# Altium footprint library SMD_Bauteile.PcbLib: 355 footprints (part 6 of 23)
Each footprint in its own frame and in the unit in brackets; x right, y up, seen from the top. Pads: shape width x height; smd on the part's side, far side on the other; paste and mask are expansions set on the pad; w line width, h text height; cw(c..) or ccw(c..) is an arc to the next point about the centre after c.
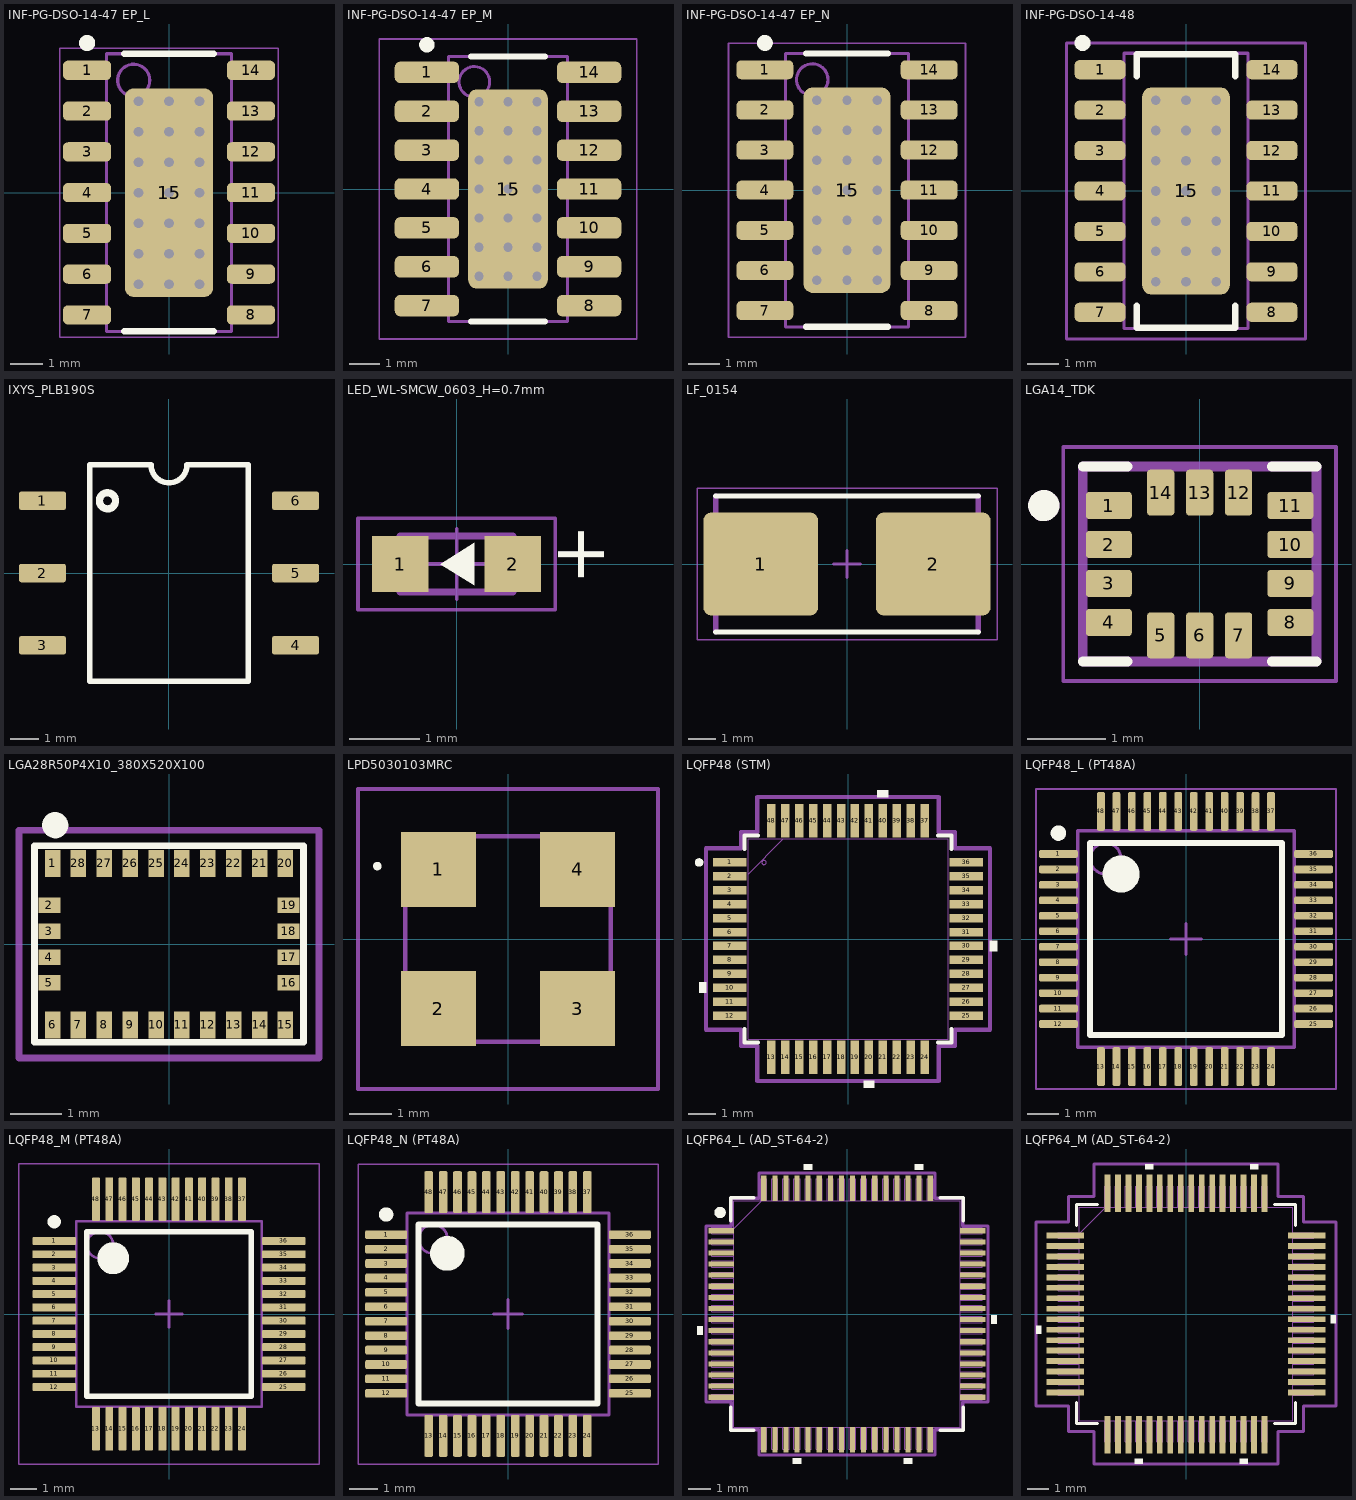
[diagram p5: the footprints below, top view; thin cyan lines are the x and y axes]

## INF-PG-DSO-14-47 EP_L [mm] "SOP, 14-Leads, Body 8.65x3.9mm, Pitch 1.27mm, Thermal Pad 6.5x2.75mm, IPC High Density"
height 1.7
pads (15):
  rrect50% 1.5x0.6 smd: 1(-2.55,3.81) 2(-2.55,2.54) 3(-2.55,1.27) 4(-2.55,0) 5(-2.55,-1.27) 6(-2.55,-2.54) 7(-2.55,-3.81) 8(2.55,-3.81) 9(2.55,-2.54) 10(2.55,-1.27) 11(2.55,0) 12(2.55,1.27) 13(2.55,2.54) 14(2.55,3.81)
  rrect20% 2.75x6.5 smd: 15(0,0)
via 0.95,0 diameter 0.7 hole 0.3
via 0.95,-0.95 diameter 0.7 hole 0.3
via -0.95,-0.95 diameter 0.7 hole 0.3
via 0,0 diameter 0.7 hole 0.3
via 0,-0.95 diameter 0.7 hole 0.3
via 0.95,1.9 diameter 0.7 hole 0.3
via 0.95,2.85 diameter 0.7 hole 0.3
via 0.95,-1.9 diameter 0.7 hole 0.3
via 0.95,-2.85 diameter 0.7 hole 0.3
via 0,-2.85 diameter 0.7 hole 0.3
via 0,-1.9 diameter 0.7 hole 0.3
via 0,0.95 diameter 0.7 hole 0.3
via 0,1.9 diameter 0.7 hole 0.3
via -0.95,1.9 diameter 0.7 hole 0.3
via -0.95,0.95 diameter 0.7 hole 0.3
via -0.95,0 diameter 0.7 hole 0.3
via -0.95,-1.9 diameter 0.7 hole 0.3
via -0.95,-2.85 diameter 0.7 hole 0.3
via 0.95,0.95 diameter 0.7 hole 0.3
via 0,2.85 diameter 0.7 hole 0.3
via -0.95,2.85 diameter 0.7 hole 0.3
Top Overlay:
  circle w0.25: c-2.55,4.66 r0.125
  lines w0.2: -1.4,-4.325 1.4,-4.325 ; -1.4,4.325 1.4,4.325
Top Component Center:
  lines w0.1: -0.5,0 0.5,0 ; 0,-0.5 0,0.5
Top Component Outline:
  circle w0.1: c-1.1,3.5 r0.5
  lines w0.1: -1.95,-4.325 1.95,-4.325 1.95,4.325 -1.95,4.325 -1.95,-4.325
Top Courtyard (Mech26):
  lines w0.05: -3.4,-4.5 3.4,-4.5 3.4,4.5 -3.4,4.5 -3.4,-4.5
3D body: height 1.7, standoff 0, extent -1.95,-4.325 1.95,4.325

## INF-PG-DSO-14-47 EP_M [mm] "SOP, 14-Leads, Body 8.65x3.9mm, Pitch 1.27mm, Thermal Pad 6.5x2.75mm, IPC Low Density"
height 1.7
pads (15):
  rrect50% 2.1x0.7 smd: 1(-2.65,3.81) 2(-2.65,2.54) 3(-2.65,1.27) 4(-2.65,0) 5(-2.65,-1.27) 6(-2.65,-2.54) 7(-2.65,-3.81) 8(2.65,-3.81) 9(2.65,-2.54) 10(2.65,-1.27) 11(2.65,0) 12(2.65,1.27) 13(2.65,2.54) 14(2.65,3.81)
  rrect20% 2.6x6.5 smd: 15(0,0)
via 0.95,0 diameter 0.7 hole 0.3
via 0.95,-0.95 diameter 0.7 hole 0.3
via -0.95,-0.95 diameter 0.7 hole 0.3
via 0,0 diameter 0.7 hole 0.3
via 0,-0.95 diameter 0.7 hole 0.3
via 0.95,1.9 diameter 0.7 hole 0.3
via 0.95,2.85 diameter 0.7 hole 0.3
via 0.95,-1.9 diameter 0.7 hole 0.3
via 0.95,-2.85 diameter 0.7 hole 0.3
via 0,-2.85 diameter 0.7 hole 0.3
via 0,-1.9 diameter 0.7 hole 0.3
via 0,0.95 diameter 0.7 hole 0.3
via 0,1.9 diameter 0.7 hole 0.3
via -0.95,1.9 diameter 0.7 hole 0.3
via -0.95,0.95 diameter 0.7 hole 0.3
via -0.95,0 diameter 0.7 hole 0.3
via -0.95,-1.9 diameter 0.7 hole 0.3
via -0.95,-2.85 diameter 0.7 hole 0.3
via 0.95,0.95 diameter 0.7 hole 0.3
via 0,2.85 diameter 0.7 hole 0.3
via -0.95,2.85 diameter 0.7 hole 0.3
Top Overlay:
  circle w0.25: c-2.65,4.71 r0.125
  lines w0.2: -1.2,-4.325 1.2,-4.325 ; -1.2,4.325 1.2,4.325
Top Component Center:
  lines w0.1: -0.5,0 0.5,0 ; 0,-0.5 0,0.5
Top Component Outline:
  circle w0.1: c-1.1,3.5 r0.5
  lines w0.1: -1.95,-4.325 -1.95,4.325 1.95,4.325 1.95,-4.325 -1.95,-4.325
Top Courtyard (Mech26):
  lines w0.05: -4.2,-4.9 -4.2,4.9 4.2,4.9 4.2,-4.9 -4.2,-4.9
3D body: height 1.7, standoff 0, extent -1.95,-4.325 1.95,4.325

## INF-PG-DSO-14-47 EP_N [mm] "SOP, 14-Leads, Body 8.65x3.9mm, Pitch 1.27mm, Thermal Pad 6.5x2.75mm, IPC Medium Density"
height 1.7
pads (15):
  rrect50% 1.8x0.6 smd: 1(-2.6,3.81) 2(-2.6,2.54) 3(-2.6,1.27) 4(-2.6,0) 5(-2.6,-1.27) 6(-2.6,-2.54) 7(-2.6,-3.81) 8(2.6,-3.81) 9(2.6,-2.54) 10(2.6,-1.27) 11(2.6,0) 12(2.6,1.27) 13(2.6,2.54) 14(2.6,3.81)
  rrect20% 2.75x6.5 smd: 15(0,0)
via -0.95,2.85 diameter 0.7 hole 0.3
via 0,2.85 diameter 0.7 hole 0.3
via 0.95,0.95 diameter 0.7 hole 0.3
via -0.95,-2.85 diameter 0.7 hole 0.3
via -0.95,-1.9 diameter 0.7 hole 0.3
via -0.95,0 diameter 0.7 hole 0.3
via -0.95,0.95 diameter 0.7 hole 0.3
via -0.95,1.9 diameter 0.7 hole 0.3
via 0,1.9 diameter 0.7 hole 0.3
via 0,0.95 diameter 0.7 hole 0.3
via 0,-1.9 diameter 0.7 hole 0.3
via 0,-2.85 diameter 0.7 hole 0.3
via 0.95,-2.85 diameter 0.7 hole 0.3
via 0.95,-1.9 diameter 0.7 hole 0.3
via 0.95,2.85 diameter 0.7 hole 0.3
via 0.95,1.9 diameter 0.7 hole 0.3
via 0,-0.95 diameter 0.7 hole 0.3
via 0,0 diameter 0.7 hole 0.3
via -0.95,-0.95 diameter 0.7 hole 0.3
via 0.95,-0.95 diameter 0.7 hole 0.3
via 0.95,0 diameter 0.7 hole 0.3
Top Overlay:
  circle w0.25: c-2.6,4.66 r0.125
  lines w0.2: -1.3,-4.325 1.3,-4.325 ; -1.3,4.325 1.3,4.325
Top Component Center:
  lines w0.1: -0.5,0 0.5,0 ; 0,-0.5 0,0.5
Top Component Outline:
  circle w0.1: c-1.1,3.5 r0.5
  lines w0.1: -1.95,-4.325 1.95,-4.325 1.95,4.325 -1.95,4.325 -1.95,-4.325
Top Courtyard (Mech26):
  lines w0.05: -3.75,-4.65 3.75,-4.65 3.75,4.65 -3.75,4.65 -3.75,-4.65
3D body: height 1.7, standoff 0, extent -1.95,-4.325 1.95,4.325

## INF-PG-DSO-14-48 [mm] "SOIC,1.27mm pitch;14 pin,3.90mm W X 8.65mm L X 1.70mm H body (w/thermal tab)"
height 1.7
pads (15):
  rrect50% 1.6x0.6 smd paste+0 mask+0: 1(-2.7,3.81) 2(-2.7,2.54) 3(-2.7,1.27) 4(-2.7,0) 5(-2.7,-1.27) 6(-2.7,-2.54) 7(-2.7,-3.81) 8(2.7,-3.81) 9(2.7,-2.54) 10(2.7,-1.27) 11(2.7,0) 12(2.7,1.27) 13(2.7,2.54) 14(2.7,3.81)
  rrect20% 2.75x6.5 smd paste+0 mask+0: 15(0,0)
via -0.95,2.85 diameter 0.7 hole 0.3
via 0,2.85 diameter 0.7 hole 0.3
via 0.95,0.95 diameter 0.7 hole 0.3
via -0.95,-2.85 diameter 0.7 hole 0.3
via -0.95,-1.9 diameter 0.7 hole 0.3
via -0.95,0 diameter 0.7 hole 0.3
via -0.95,0.95 diameter 0.7 hole 0.3
via -0.95,1.9 diameter 0.7 hole 0.3
via 0,1.9 diameter 0.7 hole 0.3
via 0,0.95 diameter 0.7 hole 0.3
via 0,-1.9 diameter 0.7 hole 0.3
via 0,-2.85 diameter 0.7 hole 0.3
via 0.95,-2.85 diameter 0.7 hole 0.3
via 0.95,-1.9 diameter 0.7 hole 0.3
via 0.95,2.85 diameter 0.7 hole 0.3
via 0.95,1.9 diameter 0.7 hole 0.3
via 0,-0.95 diameter 0.7 hole 0.3
via 0,0 diameter 0.7 hole 0.3
via -0.95,-0.95 diameter 0.7 hole 0.3
via 0.95,-0.95 diameter 0.7 hole 0.3
via 0.95,0 diameter 0.7 hole 0.3
Top Overlay:
  circle w0.25: c-3.25,4.65 r0.125
  lines w0.2: -1.55,-3.6 -1.55,-4.3 1.55,-4.3 1.55,-3.6 ; -1.55,3.6 -1.55,4.3 1.55,4.3 1.55,3.6
Top Component Center:
  lines w0.1: -0.5,0 0.5,0 ; 0,-0.5 0,0.5
Top Component Outline:
  lines w0.1: -1.95,-4.325 -1.95,4.325 1.95,4.325 1.95,-4.325 -1.95,-4.325
Top Courtyard (Mech26):
  lines w0.1: -3.75,-4.65 -3.75,4.65 3.75,4.65 3.75,-4.65 -3.75,-4.65
3D body "DSO-14-33.stp": height 1.71, standoff 0, extent -3,-4.325 3,4.325

## IXYS_PLB190S [mm]
pads (6):
  rrect25% 1.65x0.65 smd: 1(-4.445,2.54) 2(-4.445,0) 3(-4.445,-2.54) 4(4.455,-2.54) 5(4.455,0) 6(4.455,2.54)
Top Overlay:
  circle w0.254: c-2.159,2.54 r0.284
  lines w0.2: -2.785,-3.81 -2.785,3.81 -0.63,3.81 ccw(c0.005,3.81) 0.64,3.81 2.795,3.81 2.795,-3.81 -2.785,-3.81
3D body: height 3.3, standoff 1.14, extent -3.175,-4.191 3.175,4.191

## LED_WL-SMCW_0603_H=0.7mm [mm] "SMD Mono-color Chip LED, body 1.6x0.8mm"
height 0.7
pads (2):
  rect 0.8x0.8 smd: 1(-0.8,0) 2(0.8,0)
Top Overlay:
  region: -0.233,0 0.25,-0.3 0.25,0.3
  text "+" at 2.1,-0.3 h0.76
Bottom Designator:
  lines w0.05: -1.4,-0.65 -1.4,0.65 1.4,0.65 1.4,-0.65 -1.4,-0.65
Bottom 3D Body:
  lines w0.05: -0.5,0 0.5,0 ; 0,-0.5 0,0.5
Top Courtyard (Mech14):
  lines w0.1: -0.8,-0.4 0.8,-0.4 0.8,0.4 -0.8,0.4 -0.8,-0.4
3D body "150060xxx.stp": height 0.7, standoff 0, extent -0.8,-0.4 0.8,0.4

## LF_0154 [mm]
height 3.81
pads (2):
  rrect15% 4.24x3.81 smd: 1(-3.19,0) 2(3.19,0)
Top Overlay:
  lines w0.2: -4.863,-2.515 4.863,-2.515 ; -4.863,2.515 4.863,2.515
Top Component Center:
  lines w0.1: -0.5,0 0.5,0 ; 0,-0.5 0,0.5
Top Component Outline:
  lines w0.2: -4.863,-2.515 -4.863,2.515 -4.863,-2.515 ; 4.863,-2.515 4.863,2.515 4.863,-2.515
Top Courtyard (Mech26):
  lines w0.05: -5.55,-2.8 5.55,-2.8 5.55,2.8 -5.55,2.8 -5.55,-2.8
3D body "LF_0154.STEP": height 3.81, standoff 0, extent -4.865,-2.515 4.865,2.515

## LGA14_TDK [mm]
pads (14):
  rrect25% 0.59x0.35 smd mask+0.02: 1(-1.165,0.75) 2(-1.165,0.25) 3(-1.165,-0.25) 4(-1.165,-0.75) 8(1.165,-0.75) 9(1.165,-0.25) 10(1.165,0.25) 11(1.165,0.75)
  rrect25% 0.35x0.59 smd mask+0.02: 5(-0.5,-0.915) 6(0,-0.915) 7(0.5,-0.915) 12(0.5,0.915) 13(0,0.915) 14(-0.5,0.915)
Top Overlay:
  circle w0.2: c-2,0.75 r0.1
  lines w0.127: -1.5,-1.25 -0.925,-1.25 ; -1.5,1.25 -0.925,1.25 ; 0.925,-1.25 1.5,-1.25 ; 0.925,1.25 1.5,1.25
Mech Misc 1:
  circle w0.2: c-2,0.75 r0.1
  lines w0.127: -1.5,-1.25 -1.5,1.25 1.5,1.25 1.5,-1.25 -1.5,-1.25
Mech 15:
  lines w0.05: -1.75,-1.5 -1.75,1.5 1.75,1.5 1.75,-1.5 -1.75,-1.5
3D body "step_temp.STEP": height 0.97, standoff 0, extent -1.5,-1.25 1.5,1.25

## LGA28R50P4X10_380X520X100 [mm]
pads (28):
  rect 0.3x0.525 smd: 1(-2.25,1.562) 6(-2.25,-1.562) 7(-1.75,-1.562) 8(-1.25,-1.562) 9(-0.75,-1.562) 10(-0.25,-1.562) 11(0.25,-1.562) 12(0.75,-1.562) 13(1.25,-1.562) 14(1.75,-1.562) 15(2.25,-1.562) 20(2.25,1.562) 21(1.75,1.562) 22(1.25,1.562) 23(0.75,1.562) 24(0.25,1.562) 25(-0.25,1.562) 26(-0.75,1.562) 27(-1.25,1.562) 28(-1.75,1.562)
  rect 0.425x0.3 smd: 2(-2.312,0.75) 3(-2.312,0.25) 4(-2.312,-0.25) 5(-2.312,-0.75) 16(2.312,-0.75) 17(2.312,-0.25) 18(2.312,0.25) 19(2.312,0.75)
Top Overlay:
  circle w0.305: c-2.2,2.3 r0.1
  lines w0.127: -2.6,-1.9 -2.6,1.9 2.6,1.9 2.6,-1.9 -2.6,-1.9
Mech 15:
  lines w0.127: -2.9,-2.2 2.9,-2.2 2.9,2.2 -2.9,2.2 -2.9,-2.2

## LPD5030103MRC [mm]
pads (4):
  rect 1.75x1.75 smd: 1(-1.625,1.625) 2(-1.625,-1.625) 3(1.625,-1.625) 4(1.625,1.625)
Top Overlay:
  lines w0.1: -3.1,1.7 cw(c-3.05,1.7) -3,1.7 cw(c-3.05,1.7) -3.1,1.7
Mech 15:
  lines w0.1: -2.4,-1.6 -1.6,-2.4 1.6,-2.4 2.4,-1.6 2.4,1.6 1.6,2.4 -1.6,2.4 -2.4,1.6 -2.4,-1.6
Top 3D Body:
  lines w0.1: -3.5,-3.5 -3.5,3.5 3.5,3.5 3.5,-3.5 -3.5,-3.5
3D body "LPD5030-103MRC.stp": height 5.8, standoff -4.65, extent -10,-3.376 10,3.376

## LQFP48 (STM) [mm]
pads (48):
  rect 1.194x0.305 smd paste+0 mask+0: 1(-4.25,2.75) 2(-4.25,2.25) 3(-4.25,1.75) 4(-4.25,1.25) 5(-4.25,0.75) 6(-4.25,0.25) 7(-4.25,-0.25) 8(-4.25,-0.75) 9(-4.25,-1.25) 10(-4.25,-1.75) 11(-4.25,-2.25) 12(-4.25,-2.75) 25(4.25,-2.75) 26(4.25,-2.25) 27(4.25,-1.75) 28(4.25,-1.25) 29(4.25,-0.75) 30(4.25,-0.25) 31(4.25,0.25) 32(4.25,0.75) 33(4.25,1.25) 34(4.25,1.75) 35(4.25,2.25) 36(4.25,2.75)
  rect 0.305x1.194 smd paste+0 mask+0: 13(-2.75,-4.25) 14(-2.25,-4.25) 15(-1.75,-4.25) 16(-1.25,-4.25) 17(-0.75,-4.25) 18(-0.25,-4.25) 19(0.25,-4.25) 20(0.75,-4.25) 21(1.25,-4.25) 22(1.75,-4.25) 23(2.25,-4.25) 24(2.75,-4.25) 37(2.75,4.25) 38(2.25,4.25) 39(1.75,4.25) 40(1.25,4.25) 41(0.75,4.25) 42(0.25,4.25) 43(-0.25,4.25) 44(-0.75,4.25) 45(-1.25,4.25) 46(-1.75,4.25) 47(-2.25,4.25) 48(-2.75,4.25)
Top Overlay:
  circle w0.152: c-5.351,2.75 r0.076
  region: 1.441,5.101 1.06,5.101 1.06,5.355 1.441,5.355
  region: 5.101,-0.059 5.355,-0.059 5.355,-0.44 5.101,-0.44
  region: 0.941,-5.101 0.56,-5.101 0.56,-5.355 0.941,-5.355
  region: -5.101,-1.559 -5.355,-1.559 -5.355,-1.94 -5.101,-1.94
  lines w0.152: -3.721,-3.235 -3.721,-3.721 -3.235,-3.721 ; -3.721,3.235 -3.721,3.721 -3.235,3.721 ; 3.235,-3.721 3.721,-3.721 3.721,-3.235 ; 3.235,3.721 3.721,3.721 3.721,3.235
Mech Misc 1:
  circle w0: c-3.018,2.75 r0.076
  lines w0.025: -3.594,2.324 -2.324,3.594 ; -3.594,-3.594 -3.594,3.594 3.594,3.594 3.594,-3.594 -3.594,-3.594
Mech 15:
  lines w0.152: -5.101,-3.258 -5.101,3.258 -3.848,3.258 -3.848,3.848 -3.258,3.848 -3.258,5.101 3.258,5.101 3.258,3.848 3.848,3.848 3.848,3.258 5.101,3.258 5.101,-3.258 3.848,-3.258 3.848,-3.848 3.258,-3.848 3.258,-5.101 -3.258,-5.101 -3.258,-3.848 -3.848,-3.848 -3.848,-3.258 -5.101,-3.258
3D body "LQFP48-7x7mm.step": height 1.6, standoff 0, extent -4.497,-4.497 4.497,4.497

## LQFP48_L (PT48A) [mm] "QFP, 48-Leads, Body 7x7mm, Pitch 0.5mm, IPC High Density"
height 1.6
pads (48):
  rrect40% 1.25x0.25 smd: 1(-4.125,2.75) 2(-4.125,2.25) 3(-4.125,1.75) 4(-4.125,1.25) 5(-4.125,0.75) 6(-4.125,0.25) 7(-4.125,-0.25) 8(-4.125,-0.75) 9(-4.125,-1.25) 10(-4.125,-1.75) 11(-4.125,-2.25) 12(-4.125,-2.75) 25(4.125,-2.75) 26(4.125,-2.25) 27(4.125,-1.75) 28(4.125,-1.25) 29(4.125,-0.75) 30(4.125,-0.25) 31(4.125,0.25) 32(4.125,0.75) 33(4.125,1.25) 34(4.125,1.75) 35(4.125,2.25) 36(4.125,2.75)
  rrect40% 0.25x1.25 smd: 13(-2.75,-4.125) 14(-2.25,-4.125) 15(-1.75,-4.125) 16(-1.25,-4.125) 17(-0.75,-4.125) 18(-0.25,-4.125) 19(0.25,-4.125) 20(0.75,-4.125) 21(1.25,-4.125) 22(1.75,-4.125) 23(2.25,-4.125) 24(2.75,-4.125) 37(2.75,4.125) 38(2.25,4.125) 39(1.75,4.125) 40(1.25,4.125) 41(0.75,4.125) 42(0.25,4.125) 43(-0.25,4.125) 44(-0.75,4.125) 45(-1.25,4.125) 46(-1.75,4.125) 47(-2.25,4.125) 48(-2.75,4.125)
Top Overlay:
  circle w0.6: c-2.1,2.1 r0.3
  circle w0.25: c-4.125,3.425 r0.125
  lines w0.2: -3.1,-3.1 3.1,-3.1 3.1,3.1 -3.1,3.1 -3.1,-3.1
Mechanical 1:
  text ".Designator" at -1.524,-0.508 h1.02
Mech Misc 1:
  circle w0.1: c-2.6,2.6 r0.5
  lines w0.1: -3.5,-3.5 3.5,-3.5 3.5,3.5 -3.5,3.5 -3.5,-3.5
Mech 15:
  lines w0.05: -4.85,-4.85 4.85,-4.85 4.85,4.85 -4.85,4.85 -4.85,-4.85
  lines w0.1: -0.5,0 0.5,0 ; 0,-0.5 0,0.5
3D body "PT0048A.stp": height 1.5, standoff 0, extent -4.508,-4.508 4.508,4.508

## LQFP48_M (PT48A) [mm] "QFP, 48-Leads, Body 7x7mm, Pitch 0.5mm, IPC Low Density"
height 1.6
pads (48):
  rrect33% 1.65x0.3 smd: 1(-4.325,2.75) 2(-4.325,2.25) 3(-4.325,1.75) 4(-4.325,1.25) 5(-4.325,0.75) 6(-4.325,0.25) 7(-4.325,-0.25) 8(-4.325,-0.75) 9(-4.325,-1.25) 10(-4.325,-1.75) 11(-4.325,-2.25) 12(-4.325,-2.75) 25(4.325,-2.75) 26(4.325,-2.25) 27(4.325,-1.75) 28(4.325,-1.25) 29(4.325,-0.75) 30(4.325,-0.25) 31(4.325,0.25) 32(4.325,0.75) 33(4.325,1.25) 34(4.325,1.75) 35(4.325,2.25) 36(4.325,2.75)
  rrect33% 0.3x1.65 smd: 13(-2.75,-4.325) 14(-2.25,-4.325) 15(-1.75,-4.325) 16(-1.25,-4.325) 17(-0.75,-4.325) 18(-0.25,-4.325) 19(0.25,-4.325) 20(0.75,-4.325) 21(1.25,-4.325) 22(1.75,-4.325) 23(2.25,-4.325) 24(2.75,-4.325) 37(2.75,4.325) 38(2.25,4.325) 39(1.75,4.325) 40(1.25,4.325) 41(0.75,4.325) 42(0.25,4.325) 43(-0.25,4.325) 44(-0.75,4.325) 45(-1.25,4.325) 46(-1.75,4.325) 47(-2.25,4.325) 48(-2.75,4.325)
Top Overlay:
  circle w0.25: c-4.325,3.475 r0.125
  circle w0.6: c-2.1,2.1 r0.3
  lines w0.2: -3.1,-3.1 -3.1,3.1 3.1,3.1 3.1,-3.1 -3.1,-3.1
Mechanical 1:
  text ".Designator" at -1.524,-0.508 h1.02
Mech Misc 1:
  circle w0.1: c-2.6,2.6 r0.5
  lines w0.1: -3.5,-3.5 -3.5,3.5 3.5,3.5 3.5,-3.5 -3.5,-3.5
Mech 15:
  lines w0.05: -5.65,-5.65 -5.65,5.65 5.65,5.65 5.65,-5.65 -5.65,-5.65
  lines w0.1: -0.5,0 0.5,0 ; 0,-0.5 0,0.5
3D body "PT0048A.stp": height 1.5, standoff 0, extent -4.508,-4.508 4.508,4.508

## LQFP48_N (PT48A) [mm] "QFP, 48-Leads, Body 7x7mm, Pitch 0.5mm, IPC Medium Density"
height 1.6
pads (48):
  rrect33% 1.45x0.3 smd: 1(-4.225,2.75) 2(-4.225,2.25) 3(-4.225,1.75) 4(-4.225,1.25) 5(-4.225,0.75) 6(-4.225,0.25) 7(-4.225,-0.25) 8(-4.225,-0.75) 9(-4.225,-1.25) 10(-4.225,-1.75) 11(-4.225,-2.25) 12(-4.225,-2.75) 25(4.225,-2.75) 26(4.225,-2.25) 27(4.225,-1.75) 28(4.225,-1.25) 29(4.225,-0.75) 30(4.225,-0.25) 31(4.225,0.25) 32(4.225,0.75) 33(4.225,1.25) 34(4.225,1.75) 35(4.225,2.25) 36(4.225,2.75)
  rrect33% 0.3x1.45 smd: 13(-2.75,-4.225) 14(-2.25,-4.225) 15(-1.75,-4.225) 16(-1.25,-4.225) 17(-0.75,-4.225) 18(-0.25,-4.225) 19(0.25,-4.225) 20(0.75,-4.225) 21(1.25,-4.225) 22(1.75,-4.225) 23(2.25,-4.225) 24(2.75,-4.225) 37(2.75,4.225) 38(2.25,4.225) 39(1.75,4.225) 40(1.25,4.225) 41(0.75,4.225) 42(0.25,4.225) 43(-0.25,4.225) 44(-0.75,4.225) 45(-1.25,4.225) 46(-1.75,4.225) 47(-2.25,4.225) 48(-2.75,4.225)
Top Overlay:
  circle w0.25: c-4.225,3.45 r0.125
  circle w0.6: c-2.1,2.1 r0.3
  lines w0.2: -3.1,-3.1 -3.1,3.1 3.1,3.1 3.1,-3.1 -3.1,-3.1
Mechanical 1:
  text ".Designator" at -1.524,-0.508 h1.02
Mech Misc 1:
  circle w0.1: c-2.6,2.6 r0.5
  lines w0.1: -3.5,-3.5 -3.5,3.5 3.5,3.5 3.5,-3.5 -3.5,-3.5
Mech 15:
  lines w0.05: -5.2,-5.2 -5.2,5.2 5.2,5.2 5.2,-5.2 -5.2,-5.2
  lines w0.1: -0.5,0 0.5,0 ; 0,-0.5 0,0.5
3D body "PT0048A.stp": height 1.5, standoff 0, extent -4.508,-4.508 4.508,4.508

## LQFP64_L (AD_ST-64-2) [mil]
pads (64):
  rect 46x9 smd paste+0 mask+0: 1(-223,147.64) 2(-223,127.95) 3(-223,108.27) 4(-223,88.58) 5(-223,68.9) 6(-223,49.21) 7(-223,29.53) 8(-223,9.84) 9(-223,-9.84) 10(-223,-29.53) 11(-223,-49.21) 12(-223,-68.9) 13(-223,-88.58) 14(-223,-108.27) 15(-223,-127.95) 16(-223,-147.64) 33(223,-147.64) 34(223,-127.95) 35(223,-108.27) 36(223,-88.58) 37(223,-68.9) 38(223,-49.21) 39(223,-29.53) 40(223,-9.84) 41(223,9.84) 42(223,29.53) 43(223,49.21) 44(223,68.9) 45(223,88.58) 46(223,108.27) 47(223,127.95) 48(223,147.64)
  rect 9x46 smd paste+0 mask+0: 17(-147.64,-223) 18(-127.95,-223) 19(-108.27,-223) 20(-88.58,-223) 21(-68.9,-223) 22(-49.21,-223) 23(-29.53,-223) 24(-9.84,-223) 25(9.84,-223) 26(29.53,-223) 27(49.21,-223) 28(68.9,-223) 29(88.58,-223) 30(108.27,-223) 31(127.95,-223) 32(147.64,-223) 49(147.64,223) 50(127.95,223) 51(108.27,223) 52(88.58,223) 53(68.9,223) 54(49.21,223) 55(29.53,223) 56(9.84,223) 57(-9.84,223) 58(-29.53,223) 59(-49.21,223) 60(-68.9,223) 61(-88.58,223) 62(-108.27,223) 63(-127.95,223) 64(-147.64,223)
Top Overlay:
  circle w10: c-225,180 r5
  region: -256,-22.03 -266,-22.03 -266,-37.03 -256,-37.03
  region: -81.08,-256 -96.08,-256 -96.08,-266 -81.08,-266
  region: 115.77,-256 100.77,-256 100.77,-266 115.77,-266
  region: 256,-2.34 266,-2.34 266,-17.34 256,-17.34
  region: 135.45,256 120.45,256 120.45,266 135.45,266
  region: -61.4,256 -76.4,256 -76.4,266 -61.4,266
  lines w6: -206,-165.24 -206,-206 -165.24,-206 ; -206,165.24 -206,206 -165.24,206 ; 165.24,-206 206,-206 206,-165.24 ; 165.24,206 206,206 206,165.24
Mech Misc 1:
  drawing of 261 lines, arcs and shapes, not listed
Mech 15:
  lines w6: -250,-156.14 -205,-156.14 -205,-205 -156.14,-205 -156.14,-250 156.14,-250 156.14,-205 205,-205 205,-156.14 250,-156.14 250,156.14 205,156.14 205,205 156.14,205 156.14,250 -156.14,250 -156.14,205 -205,205 -205,156.14 -250,156.14 -250,-156.14
3D body: height 10, standoff 0, extent 0,0 10,10
3D body "ST_64_2_ADI.step": height 63.11, standoff 0, extent -240,-240 240,240

## LQFP64_M (AD_ST-64-2) [mil]
pads (64):
  rect 70x11 smd paste+0 mask+0: 1(-227,147.64) 2(-227,127.95) 3(-227,108.27) 4(-227,88.58) 5(-227,68.9) 6(-227,49.21) 7(-227,29.53) 8(-227,9.84) 9(-227,-9.84) 10(-227,-29.53) 11(-227,-49.21) 12(-227,-68.9) 13(-227,-88.58) 14(-227,-108.27) 15(-227,-127.95) 16(-227,-147.64) 33(227,-147.64) 34(227,-127.95) 35(227,-108.27) 36(227,-88.58) 37(227,-68.9) 38(227,-49.21) 39(227,-29.53) 40(227,-9.84) 41(227,9.84) 42(227,29.53) 43(227,49.21) 44(227,68.9) 45(227,88.58) 46(227,108.27) 47(227,127.95) 48(227,147.64)
  rect 11x70 smd paste+0 mask+0: 17(-147.64,-227) 18(-127.95,-227) 19(-108.27,-227) 20(-88.58,-227) 21(-68.9,-227) 22(-49.21,-227) 23(-29.53,-227) 24(-9.84,-227) 25(9.84,-227) 26(29.53,-227) 27(49.21,-227) 28(68.9,-227) 29(88.58,-227) 30(108.27,-227) 31(127.95,-227) 32(147.64,-227) 49(147.64,227) 50(127.95,227) 51(108.27,227) 52(88.58,227) 53(68.9,227) 54(49.21,227) 55(29.53,227) 56(9.84,227) 57(-9.84,227) 58(-29.53,227) 59(-49.21,227) 60(-68.9,227) 61(-88.58,227) 62(-108.27,227) 63(-127.95,227) 64(-147.64,227)
Top Overlay:
  region: -272,-22.03 -282,-22.03 -282,-37.03 -272,-37.03
  region: -81.08,-272 -96.08,-272 -96.08,-282 -81.08,-282
  region: 115.77,-272 100.77,-272 100.77,-282 115.77,-282
  region: 272,-2.34 282,-2.34 282,-17.34 272,-17.34
  region: 135.45,272 120.45,272 120.45,282 135.45,282
  region: -61.4,272 -76.4,272 -76.4,282 -61.4,282
  lines w6: -206,-166.24 -206,-206 -166.24,-206 ; -206,166.24 -206,206 -166.24,206 ; 166.24,-206 206,-206 206,-166.24 ; 166.24,206 206,206 206,166.24
Mech Misc 1:
  drawing of 261 lines, arcs and shapes, not listed
Mech 15:
  lines w6: -282,-173.14 -221,-173.14 -221,-221 -173.14,-221 -173.14,-282 173.14,-282 173.14,-221 221,-221 221,-173.14 282,-173.14 282,173.14 221,173.14 221,221 173.14,221 173.14,282 -173.14,282 -173.14,221 -221,221 -221,173.14 -282,173.14 -282,-173.14
3D body: height 10, standoff 0, extent 0,0 10,10
3D body "ST_64_2_ADI.step": height 63.11, standoff 0, extent -239.99,-239.99 240.01,240.01